# Altium footprint library LC-Standard-FootPrints-AD-V1.01.PcbLib: 585 footprints (part 12 of 37)
Each footprint in its own frame and in the unit in brackets; x right, y up, seen from the top. Pads: shape width x height; smd on the part's side, far side on the other; paste and mask are expansions set on the pad; w line width, h text height; cw(c..) or ccw(c..) is an arc to the next point about the centre after c.
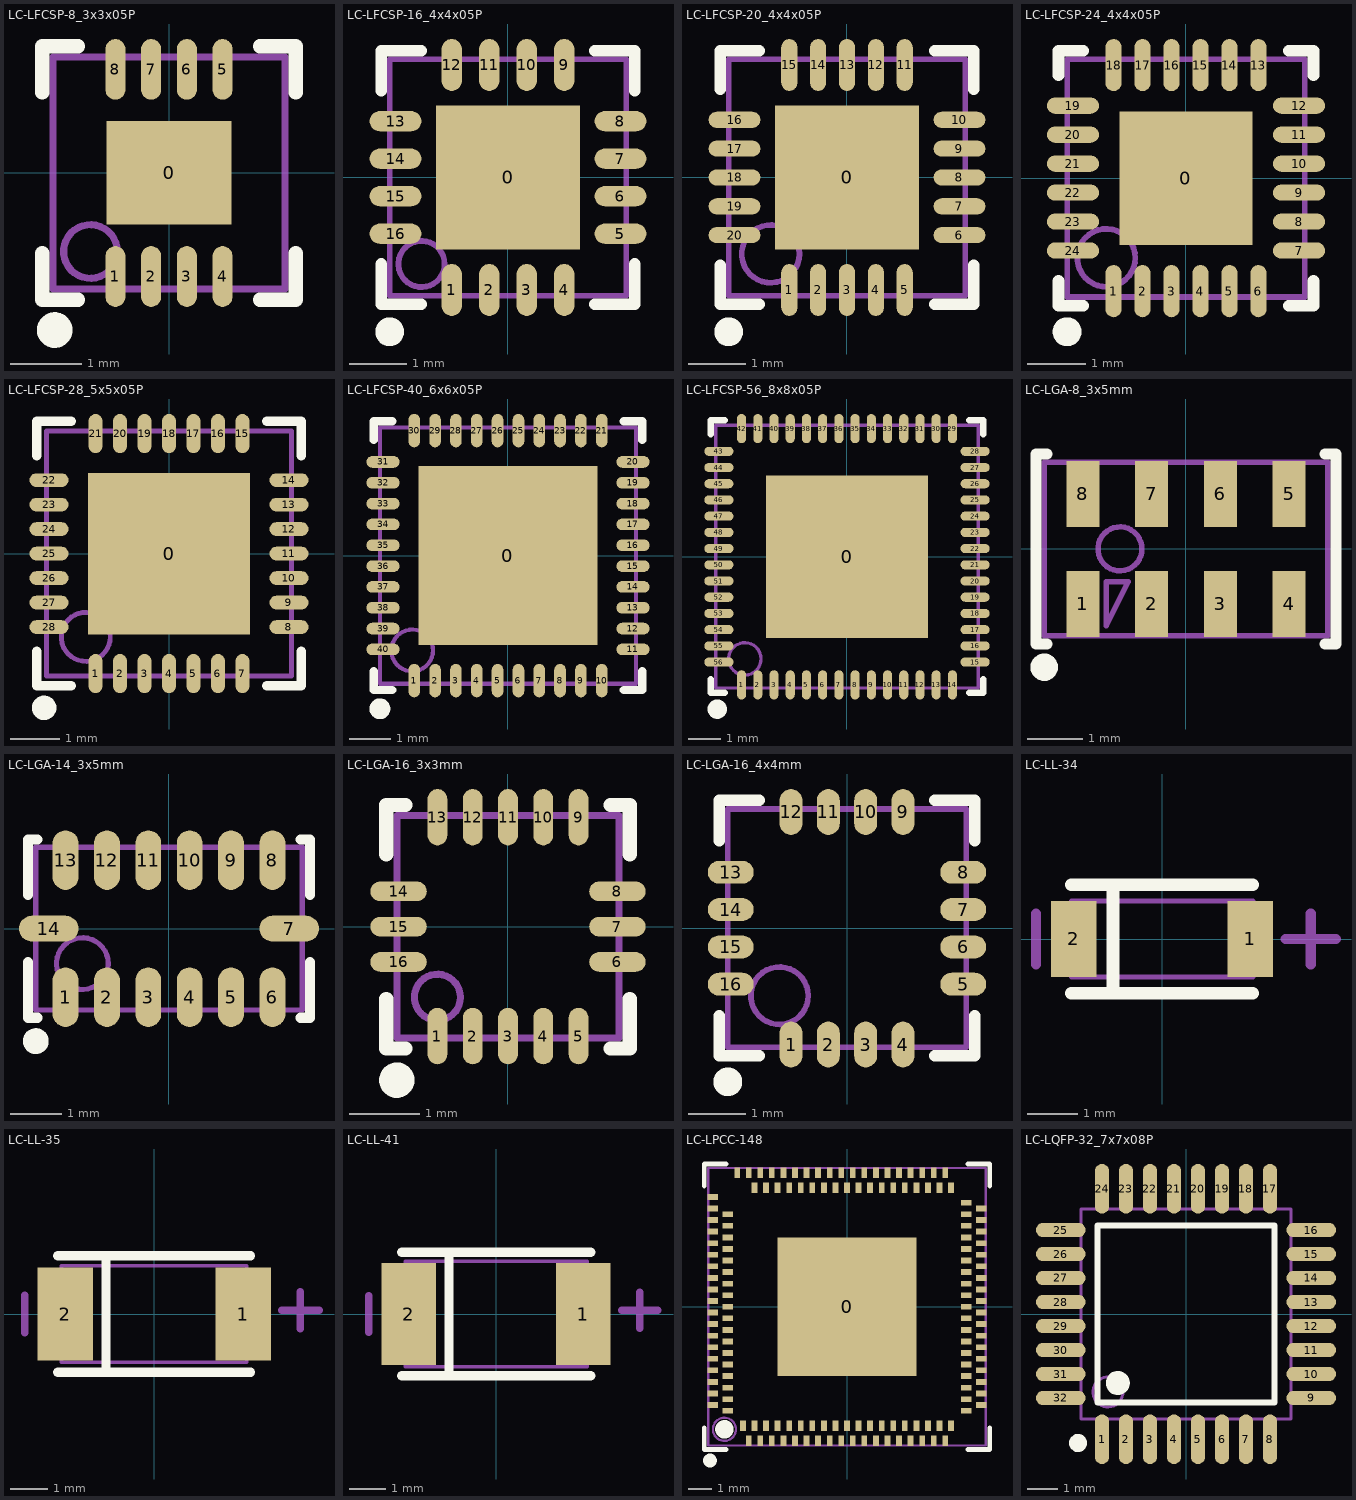
[diagram p11: the footprints below, top view; thin cyan lines are the x and y axes]

## LC-LFCSP-8_3x3x05P [mm]
pads (9):
  rect 1.75x1.45 smd mask+0.051: 0(0,0)
  oval 0.28x0.85 smd mask+0.051: 1(-0.75,-1.45) 2(-0.25,-1.45) 3(0.25,-1.45) 4(0.75,-1.45) 5(0.75,1.45) 6(0.25,1.45) 7(-0.25,1.45) 8(-0.75,1.45)
Top Overlay:
  circle w0.25: c-1.6,-2.2 r0.125
  lines w0.2: -1.775,-1.125 -1.775,-1.775 -1.275,-1.775 ; -1.775,1.125 -1.775,1.775 -1.275,1.775 ; 1.275,-1.775 1.775,-1.775 1.775,-1.125 ; 1.275,1.775 1.775,1.775 1.775,1.125
Mechanical 13:
  circle w0.1: c-1.1,-1.1 r0.376
  lines w0.1: -1.625,-1.625 -1.625,1.625 1.625,1.625 1.625,-1.625 -1.625,-1.625

## LC-LFCSP-16_4x4x05P [mm]
pads (18):
  rect 2.5x2.5 smd paste-1.225 mask+0.051: 0(0,0)
  oval 0.35x0.9 smd mask+0.051: 1(-0.975,-1.95) 2(-0.325,-1.95) 3(0.325,-1.95) 4(0.975,-1.95) 9(0.975,1.95) 10(0.325,1.95) 11(-0.325,1.95) 12(-0.975,1.95)
  oval 0.9x0.35 smd mask+0.051: 5(1.95,-0.975) 6(1.95,-0.325) 7(1.95,0.325) 8(1.95,0.975) 13(-1.95,0.975) 14(-1.95,0.325) 15(-1.95,-0.325) 16(-1.95,-0.975)
  rect 2.5x2.5 smd mask+0.051: ""(0,0)
Top Overlay:
  circle w0.25: c-2.05,-2.675 r0.125
  lines w0.2: -2.2,-1.5 -2.2,-2.2 -1.5,-2.2 ; -2.2,1.5 -2.2,2.2 -1.5,2.2 ; 1.5,-2.2 2.2,-2.2 2.2,-1.5 ; 1.5,2.2 2.2,2.2 2.2,1.5
Mechanical 13:
  circle w0.1: c-1.5,-1.5 r0.4
  lines w0.1: -2.05,-2.05 -2.05,2.05 2.05,2.05 2.05,-2.05 -2.05,-2.05

## LC-LFCSP-20_4x4x05P [mm]
pads (21):
  rect 2.5x2.5 smd mask+0.051: 0(0,0)
  oval 0.28x0.9 smd mask+0.051: 1(-1,-1.95) 2(-0.5,-1.95) 3(0,-1.95) 4(0.5,-1.95) 5(1,-1.95) 11(1,1.95) 12(0.5,1.95) 13(0,1.95) 14(-0.5,1.95) 15(-1,1.95)
  oval 0.9x0.28 smd mask+0.051: 6(1.95,-1) 7(1.95,-0.5) 8(1.95,0) 9(1.95,0.5) 10(1.95,1) 16(-1.95,1) 17(-1.95,0.5) 18(-1.95,0) 19(-1.95,-0.5) 20(-1.95,-1)
Top Overlay:
  circle w0.25: c-2.05,-2.675 r0.125
  lines w0.2: -2.2,-1.525 -2.2,-2.2 -1.525,-2.2 ; -2.2,1.525 -2.2,2.2 -1.525,2.2 ; 1.525,-2.2 2.2,-2.2 2.2,-1.525 ; 1.525,2.2 2.2,2.2 2.2,1.525
Mechanical 13:
  circle w0.1: c-1.325,-1.325 r0.5
  lines w0.1: -2.05,-2.05 -2.05,2.05 2.05,2.05 2.05,-2.05 -2.05,-2.05

## LC-LFCSP-24_4x4x05P [mm]
pads (26):
  rect 2.3x2.3 smd paste-1.05 mask+0.051: 0(0,0)
  oval 0.28x0.9 smd mask+0.051: 1(-1.25,-1.95) 2(-0.75,-1.95) 3(-0.25,-1.95) 4(0.25,-1.95) 5(0.75,-1.95) 6(1.25,-1.95) 13(1.25,1.95) 14(0.75,1.95) 15(0.25,1.95) 16(-0.25,1.95) 17(-0.75,1.95) 18(-1.25,1.95)
  oval 0.9x0.28 smd mask+0.051: 7(1.95,-1.25) 8(1.95,-0.75) 9(1.95,-0.25) 10(1.95,0.25) 11(1.95,0.75) 12(1.95,1.25) 19(-1.95,1.25) 20(-1.95,0.75) 21(-1.95,0.25) 22(-1.95,-0.25) 23(-1.95,-0.75) 24(-1.95,-1.25)
  rect 2.3x2.3 smd mask+0.051: ""(0,0)
Top Overlay:
  circle w0.25: c-2.05,-2.65 r0.125
  lines w0.2: -2.2,-1.775 -2.2,-2.2 -1.775,-2.2 ; -2.2,1.775 -2.2,2.2 -1.775,2.2 ; 1.775,-2.2 2.2,-2.2 2.2,-1.775 ; 1.775,2.2 2.2,2.2 2.2,1.775
Mechanical 13:
  circle w0.1: c-1.375,-1.375 r0.5
  lines w0.1: -2.05,-2.05 -2.05,2.05 2.05,2.05 2.05,-2.05 -2.05,-2.05

## LC-LFCSP-28_5x5x05P [mm]
pads (29):
  rect 3.3x3.3 smd mask+0.051: 0(0,0)
  oval 0.28x0.8 smd mask+0.051: 1(-1.5,-2.45) 2(-1,-2.45) 3(-0.5,-2.45) 4(0,-2.45) 5(0.5,-2.45) 6(1,-2.45) 7(1.5,-2.45) 15(1.5,2.45) 16(1,2.45) 17(0.5,2.45) 18(0,2.45) 19(-0.5,2.45) 20(-1,2.45) 21(-1.5,2.45)
  oval 0.8x0.28 smd mask+0.051: 8(2.45,-1.5) 9(2.45,-1) 10(2.45,-0.5) 11(2.45,0) 12(2.45,0.5) 13(2.45,1) 14(2.45,1.5) 22(-2.45,1.5) 23(-2.45,1) 24(-2.45,0.5) 25(-2.45,0) 26(-2.45,-0.5) 27(-2.45,-1) 28(-2.45,-1.5)
Top Overlay:
  circle w0.25: c-2.55,-3.15 r0.125
  lines w0.2: -2.7,-2 -2.7,-2.7 -2,-2.7 ; -2.7,2 -2.7,2.7 -2,2.7 ; 2,-2.7 2.7,-2.7 2.7,-2 ; 2,2.7 2.7,2.7 2.7,2
Mechanical 13:
  circle w0.1: c-1.7,-1.7 r0.5
  lines w0.1: -2.5,-2.5 2.5,-2.5 2.5,2.5 -2.5,2.5 -2.5,-2.5

## LC-LFCSP-40_6x6x05P [mm]
pads (41):
  rect 4.3x4.3 smd mask+0.051: 0(0,0)
  oval 0.28x0.8 smd mask+0.051: 1(-2.25,-3) 2(-1.75,-3) 3(-1.25,-3) 4(-0.75,-3) 5(-0.25,-3) 6(0.25,-3) 7(0.75,-3) 8(1.25,-3) 9(1.75,-3) 10(2.25,-3) 21(2.25,3) 22(1.75,3) 23(1.25,3) 24(0.75,3) 25(0.25,3) 26(-0.25,3) 27(-0.75,3) 28(-1.25,3) 29(-1.75,3) 30(-2.25,3)
  oval 0.8x0.28 smd mask+0.051: 11(3,-2.25) 12(3,-1.75) 13(3,-1.25) 14(3,-0.75) 15(3,-0.25) 16(3,0.25) 17(3,0.75) 18(3,1.25) 19(3,1.75) 20(3,2.25) 31(-3,2.25) 32(-3,1.75) 33(-3,1.25) 34(-3,0.75) 35(-3,0.25) 36(-3,-0.25) 37(-3,-0.75) 38(-3,-1.25) 39(-3,-1.75) 40(-3,-2.25)
Top Overlay:
  circle w0.25: c-3.075,-3.675 r0.125
  lines w0.2: -3.225,-2.775 -3.225,-3.225 -2.775,-3.225 ; -3.225,2.775 -3.225,3.225 -2.775,3.225 ; 2.775,-3.225 3.225,-3.225 3.225,-2.775 ; 2.775,3.225 3.225,3.225 3.225,2.775
Mechanical 13:
  circle w0.1: c-2.3,-2.275 r0.5
  lines w0.1: -3.075,-3.075 3.075,-3.075 3.075,3.075 -3.075,3.075 -3.075,-3.075

## LC-LFCSP-56_8x8x05P [mm]
pads (57):
  rect 5x5 smd mask+0.051: 0(0,0)
  oval 0.28x0.9 smd mask+0.051: 1(-3.25,-3.95) 2(-2.75,-3.95) 3(-2.25,-3.95) 4(-1.75,-3.95) 5(-1.25,-3.95) 6(-0.75,-3.95) 7(-0.25,-3.95) 8(0.25,-3.95) 9(0.75,-3.95) 10(1.25,-3.95) 11(1.75,-3.95) 12(2.25,-3.95) 13(2.75,-3.95) 14(3.25,-3.95) 29(3.25,3.95) 30(2.75,3.95) 31(2.25,3.95) 32(1.75,3.95) 33(1.25,3.95) 34(0.75,3.95) 35(0.25,3.95) 36(-0.25,3.95) 37(-0.75,3.95) 38(-1.25,3.95) 39(-1.75,3.95) 40(-2.25,3.95) 41(-2.75,3.95) 42(-3.25,3.95)
  oval 0.9x0.28 smd mask+0.051: 15(3.95,-3.25) 16(3.95,-2.75) 17(3.95,-2.25) 18(3.95,-1.75) 19(3.95,-1.25) 20(3.95,-0.75) 21(3.95,-0.25) 22(3.95,0.25) 23(3.95,0.75) 24(3.95,1.25) 25(3.95,1.75) 26(3.95,2.25) 27(3.95,2.75) 28(3.95,3.25) 43(-3.95,3.25) 44(-3.95,2.75) 45(-3.95,2.25) 46(-3.95,1.75) 47(-3.95,1.25) 48(-3.95,0.75) 49(-3.95,0.25) 50(-3.95,-0.25) 51(-3.95,-0.75) 52(-3.95,-1.25) 53(-3.95,-1.75) 54(-3.95,-2.25) 55(-3.95,-2.75) 56(-3.95,-3.25)
Top Overlay:
  circle w0.3: c-4,-4.7 r0.15
  lines w0.2: -4.2,-3.775 -4.2,-4.2 -3.775,-4.2 ; -4.2,3.775 -4.2,4.2 -3.775,4.2 ; 3.775,-4.2 4.2,-4.2 4.2,-3.775 ; 3.775,4.2 4.2,4.2 4.2,3.775
Mechanical 13:
  circle w0.1: c-3.15,-3.15 r0.5
  lines w0.1: -4.05,-4.05 4.05,-4.05 4.05,4.05 -4.05,4.05 -4.05,-4.05

## LC-LGA-8_3x5mm [mm]
pads (8):
  rect 0.6x1.2 smd: 1(-1.875,-1) 2(-0.625,-1) 3(0.625,-1) 4(1.875,-1) 5(1.875,1) 6(0.625,1) 7(-0.625,1) 8(-1.875,1)
Top Overlay:
  circle w0.25: c-2.575,-2.15 r0.125
  lines w0.2: -2.525,-1.725 -2.725,-1.725 -2.725,1.725 -2.525,1.725 ; 2.525,-1.725 2.725,-1.725 2.725,1.725 2.525,1.725
Mechanical 13:
  circle w0.1: c-1.2,0 r0.4
  lines w0.1: -2.575,-1.575 2.575,-1.575 2.575,1.575 -2.575,1.575 -2.575,-1.575 ; -1.45,-1.4 -1.45,-0.6 -1.05,-0.6 -1.45,-1.4

## LC-LGA-14_3x5mm [mm]
pads (14):
  oval 0.5x1.15 smd mask+0.051: 1(-2,-1.325) 2(-1.2,-1.325) 3(-0.4,-1.325) 4(0.4,-1.325) 5(1.2,-1.325) 6(2,-1.325) 8(2,1.325) 9(1.2,1.325) 10(0.4,1.325) 11(-0.4,1.325) 12(-1.2,1.325) 13(-2,1.325)
  oval 1.15x0.5 smd mask+0.051: 7(2.325,0) 14(-2.325,0)
Top Overlay:
  circle w0.25: c-2.575,-2.175 r0.125
  lines w0.2: -2.725,-0.65 -2.725,-1.725 -2.55,-1.725 ; -2.725,0.65 -2.725,1.725 -2.55,1.725 ; 2.55,-1.725 2.725,-1.725 2.725,-0.65 ; 2.55,1.725 2.725,1.725 2.725,0.65
Mechanical 13:
  circle w0.1: c-1.675,-0.675 r0.5
  lines w0.1: -2.575,-1.575 2.575,-1.575 2.575,1.575 -2.575,1.575 -2.575,-1.575
3D body: height 1.03, standoff -0.4, extent -2.5,-1.49 2.5,1.51

## LC-LGA-16_3x3mm [mm]
pads (16):
  oval 0.28x0.8 smd mask+0.051: 1(-1,-1.55) 2(-0.5,-1.55) 3(0,-1.55) 4(0.5,-1.55) 5(1,-1.55) 9(1,1.55) 10(0.5,1.55) 11(0,1.55) 12(-0.5,1.55) 13(-1,1.55)
  oval 0.8x0.28 smd mask+0.051: 6(1.55,-0.5) 7(1.55,0) 8(1.55,0.5) 14(-1.55,0.5) 15(-1.55,0) 16(-1.55,-0.5)
Top Overlay:
  circle w0.25: c-1.575,-2.175 r0.125
  lines w0.2: -1.725,-1.025 -1.725,-1.725 -1.45,-1.725 ; -1.725,1.025 -1.725,1.725 -1.45,1.725 ; 1.45,-1.725 1.725,-1.725 1.725,-1.025 ; 1.45,1.725 1.725,1.725 1.725,1.025
Mechanical 13:
  circle w0.1: c-1,-1 r0.326
  lines w0.1: -1.575,-1.575 1.575,-1.575 1.575,1.575 -1.575,1.575 -1.575,-1.575

## LC-LGA-16_4x4mm [mm]
pads (16):
  oval 0.4x0.8 smd mask+0.051: 1(-0.975,-2.025) 2(-0.325,-2.025) 3(0.325,-2.025) 4(0.975,-2.025) 9(0.975,2.025) 10(0.325,2.025) 11(-0.325,2.025) 12(-0.975,2.025)
  oval 0.8x0.4 smd mask+0.051: 5(2.025,-0.975) 6(2.025,-0.325) 7(2.025,0.325) 8(2.025,0.975) 13(-2.025,0.975) 14(-2.025,0.325) 15(-2.025,-0.325) 16(-2.025,-0.975)
Top Overlay:
  circle w0.25: c-2.075,-2.675 r0.125
  lines w0.2: -2.225,-1.525 -2.225,-2.225 -1.525,-2.225 ; -2.225,1.525 -2.225,2.225 -1.525,2.225 ; 1.525,-2.225 2.225,-2.225 2.225,-1.525 ; 1.525,2.225 2.225,2.225 2.225,1.525
Mechanical 13:
  circle w0.1: c-1.175,-1.175 r0.5
  lines w0.1: -2.075,-2.075 -2.075,2.075 2.075,2.075 2.075,-2.075 -2.075,-2.075

## LC-LL-34 [mm]
pads (2):
  rect 0.9x1.5 smd: 1(1.75,0) 2(-1.75,0)
Top Overlay:
  lines w0.254: -1.8,-1.075 1.8,-1.075 ; -1.8,1.075 1.8,1.075 ; -0.975,-1.075 -0.975,1.075
Mechanical 13:
  lines w0.1: -1.8,-0.75 1.8,-0.75 1.8,0.75 -1.8,0.75 -1.8,-0.75
Mechanical 15:
  lines w0.203: -2.5,-0.5 -2.5,0.5 ; 2.45,0 3.45,0 ; 2.95,-0.5 2.95,0.5

## LC-LL-35 [mm]
pads (2):
  rect 1.5x2.5 smd: 1(2.4,0) 2(-2.4,0)
Top Overlay:
  lines w0.254: -2.6,-1.575 2.6,-1.575 ; -2.6,1.575 2.6,1.575 ; -1.3,-1.575 -1.3,1.575
Mechanical 13:
  lines w0.1: -2.5,-1.3 2.5,-1.3 2.5,1.3 -2.5,1.3 -2.5,-1.3
Mechanical 15:
  lines w0.203: -3.5,-0.5 -3.5,0.5 ; 3.45,0.1 4.45,0.1 ; 3.95,-0.4 3.95,0.6

## LC-LL-41 [mm]
pads (2):
  rect 1.5x2.8 smd: 1(2.4,0) 2(-2.4,0)
Top Overlay:
  lines w0.254: -2.6,-1.7 2.6,-1.7 ; -2.6,1.7 2.6,1.7 ; -1.3,-1.7 -1.3,1.7
Mechanical 13:
  lines w0.1: -2.5,-1.45 2.5,-1.45 2.5,1.45 -2.5,1.45 -2.5,-1.45
Mechanical 15:
  lines w0.203: -3.5,-0.5 -3.5,0.5 ; 3.45,0.1 4.45,0.1 ; 3.95,-0.4 3.95,0.6

## LC-LPCC-148 [mm]
pads (149):
  rect 6x6 smd: 0(0,0)
  rect 0.25x0.45 smd mask+0.051: A3(-4.25,-5.8) A4(-3.75,-5.8) A5(-3.25,-5.8) A6(-2.75,-5.8) A7(-2.25,-5.8) A8(-1.75,-5.8) A9(-1.25,-5.8) A10(-0.75,-5.8) A11(-0.25,-5.8) A12(0.25,-5.8) A13(0.75,-5.8) A14(1.25,-5.8) A15(1.75,-5.8) A16(2.25,-5.8) A17(2.75,-5.8) A18(3.25,-5.8) A19(3.75,-5.8) A20(4.25,-5.8) A47(4.25,5.8) A48(3.75,5.8) A49(3.25,5.8) A50(2.75,5.8) A51(2.25,5.8) A52(1.75,5.8) A53(1.25,5.8) A54(0.75,5.8) A55(0.25,5.8) A56(-0.25,5.8) A57(-0.75,5.8) A58(-1.25,5.8) A59(-1.75,5.8) A60(-2.25,5.8) A61(-2.75,5.8) A62(-3.25,5.8) A63(-3.75,5.8) A64(-4.25,5.8) A65(-4.75,5.8) B1(-4.5,-5.15) B2(-4,-5.15) B3(-3.5,-5.15) B4(-3,-5.15) B5(-2.5,-5.15) B6(-2,-5.15) B7(-1.5,-5.15) B8(-1,-5.15) B9(-0.5,-5.15) B10(0,-5.15) B11(0.5,-5.15) B12(1,-5.15) B13(1.5,-5.15) B14(2,-5.15) B15(2.5,-5.15) B16(3,-5.15) B17(3.5,-5.15) B18(4,-5.15) B19(4.5,-5.15) B39(4.5,5.15) B40(4,5.15) B41(3.5,5.15) B42(3,5.15) B43(2.5,5.15) B44(2,5.15) B45(1.5,5.15) B46(1,5.15) B47(0.5,5.15) B48(0,5.15) B49(-0.5,5.15) B50(-1,5.15) B51(-1.5,5.15) B52(-2,5.15) B53(-2.5,5.15) B54(-3,5.15) B55(-3.5,5.15) B56(-4,5.15)
  rect 0.45x0.25 smd mask+0.051: A25(5.8,-4.25) A26(5.8,-3.75) A27(5.8,-3.25) A28(5.8,-2.75) A29(5.8,-2.25) A30(5.8,-1.75) A31(5.8,-1.25) A32(5.8,-0.75) A33(5.8,-0.25) A34(5.8,0.25) A35(5.8,0.75) A36(5.8,1.25) A37(5.8,1.75) A38(5.8,2.25) A39(5.8,2.75) A40(5.8,3.25) A41(5.8,3.75) A42(5.8,4.25) A68(-5.8,4.75) A69(-5.8,4.25) A70(-5.8,3.75) A71(-5.8,3.25) A72(-5.8,2.75) A73(-5.8,2.25) A74(-5.8,1.75) A75(-5.8,1.25) A76(-5.8,0.75) A77(-5.8,0.25) A78(-5.8,-0.25) A79(-5.8,-0.75) A80(-5.8,-1.25) A81(-5.8,-1.75) A82(-5.8,-2.25) A83(-5.8,-2.75) A84(-5.8,-3.25) A85(-5.8,-3.75) A86(-5.8,-4.25) B20(5.15,-4.5) B21(5.15,-4) B22(5.15,-3.5) B23(5.15,-3) B24(5.15,-2.5) B25(5.15,-2) B26(5.15,-1.5) B27(5.15,-1) B28(5.15,-0.5) B29(5.15,0) B30(5.15,0.5) B31(5.15,1) B32(5.15,1.5) B33(5.15,2) B34(5.15,2.5) B35(5.15,3) B36(5.15,3.5) B37(5.15,4) B38(5.15,4.5) B59(-5.15,4) B60(-5.15,3.5) B61(-5.15,3) B62(-5.15,2.5) B63(-5.15,2) B64(-5.15,1.5) B65(-5.15,1) B66(-5.15,0.5) B67(-5.15,0) B68(-5.15,-0.5) B69(-5.15,-1) B70(-5.15,-1.5) B71(-5.15,-2) B72(-5.15,-2.5) B73(-5.15,-3) B74(-5.15,-3.5) B75(-5.15,-4) B76(-5.15,-4.5)
Top Overlay:
  circle w0.4: c-5.3,-5.3 r0.2
  circle w0.3: c-5.925,-6.65 r0.15
  lines w0.2: -6.175,-5.225 -6.175,-6.175 -5.225,-6.175 ; -6.175,5.225 -6.175,6.175 -5.225,6.175 ; 5.225,-6.175 6.175,-6.175 6.175,-5.225 ; 5.225,6.175 6.175,6.175 6.175,5.225
Mechanical 13:
  circle w0.1: c-5.3,-5.3 r0.5
  lines w0.1: -6,-6 6,-6 6,6 -6,6 -6,-6

## LC-LQFP-32_7x7x08P [mm]
pads (32):
  oval 0.48x1.65 smd: 1(-2.8,-4.175) 2(-2,-4.175) 3(-1.2,-4.175) 4(-0.4,-4.175) 5(0.4,-4.175) 6(1.2,-4.175) 7(2,-4.175) 8(2.8,-4.175) 17(2.8,4.175) 18(2,4.175) 19(1.2,4.175) 20(0.4,4.175) 21(-0.4,4.175) 22(-1.2,4.175) 23(-2,4.175) 24(-2.8,4.175)
  oval 1.65x0.48 smd: 9(4.175,-2.8) 10(4.175,-2) 11(4.175,-1.2) 12(4.175,-0.4) 13(4.175,0.4) 14(4.175,1.2) 15(4.175,2) 16(4.175,2.8) 25(-4.175,2.8) 26(-4.175,2) 27(-4.175,1.2) 28(-4.175,0.4) 29(-4.175,-0.4) 30(-4.175,-1.2) 31(-4.175,-2) 32(-4.175,-2.8)
Top Overlay:
  circle w0.4: c-2.275,-2.3 r0.2
  circle w0.3: c-3.6,-4.3 r0.15
  lines w0.2: -2.95,-2.95 -2.95,2.95 2.95,2.95 2.95,-2.95 -2.95,-2.95
Mechanical 13:
  circle w0.1: c-2.6,-2.6 r0.5
  lines w0.1: -3.5,-3.5 -3.5,3.5 3.5,3.5 3.5,-3.5 -3.5,-3.5